# Altium footprint library 常用元件封装库.PcbLib: 1310 footprints (part 9 of 83)
Each footprint in its own frame and in the unit in brackets; x right, y up, seen from the top. Pads: shape width x height; smd on the part's side, far side on the other; paste and mask are expansions set on the pad; w line width, h text height; cw(c..) or ccw(c..) is an arc to the next point about the centre after c.
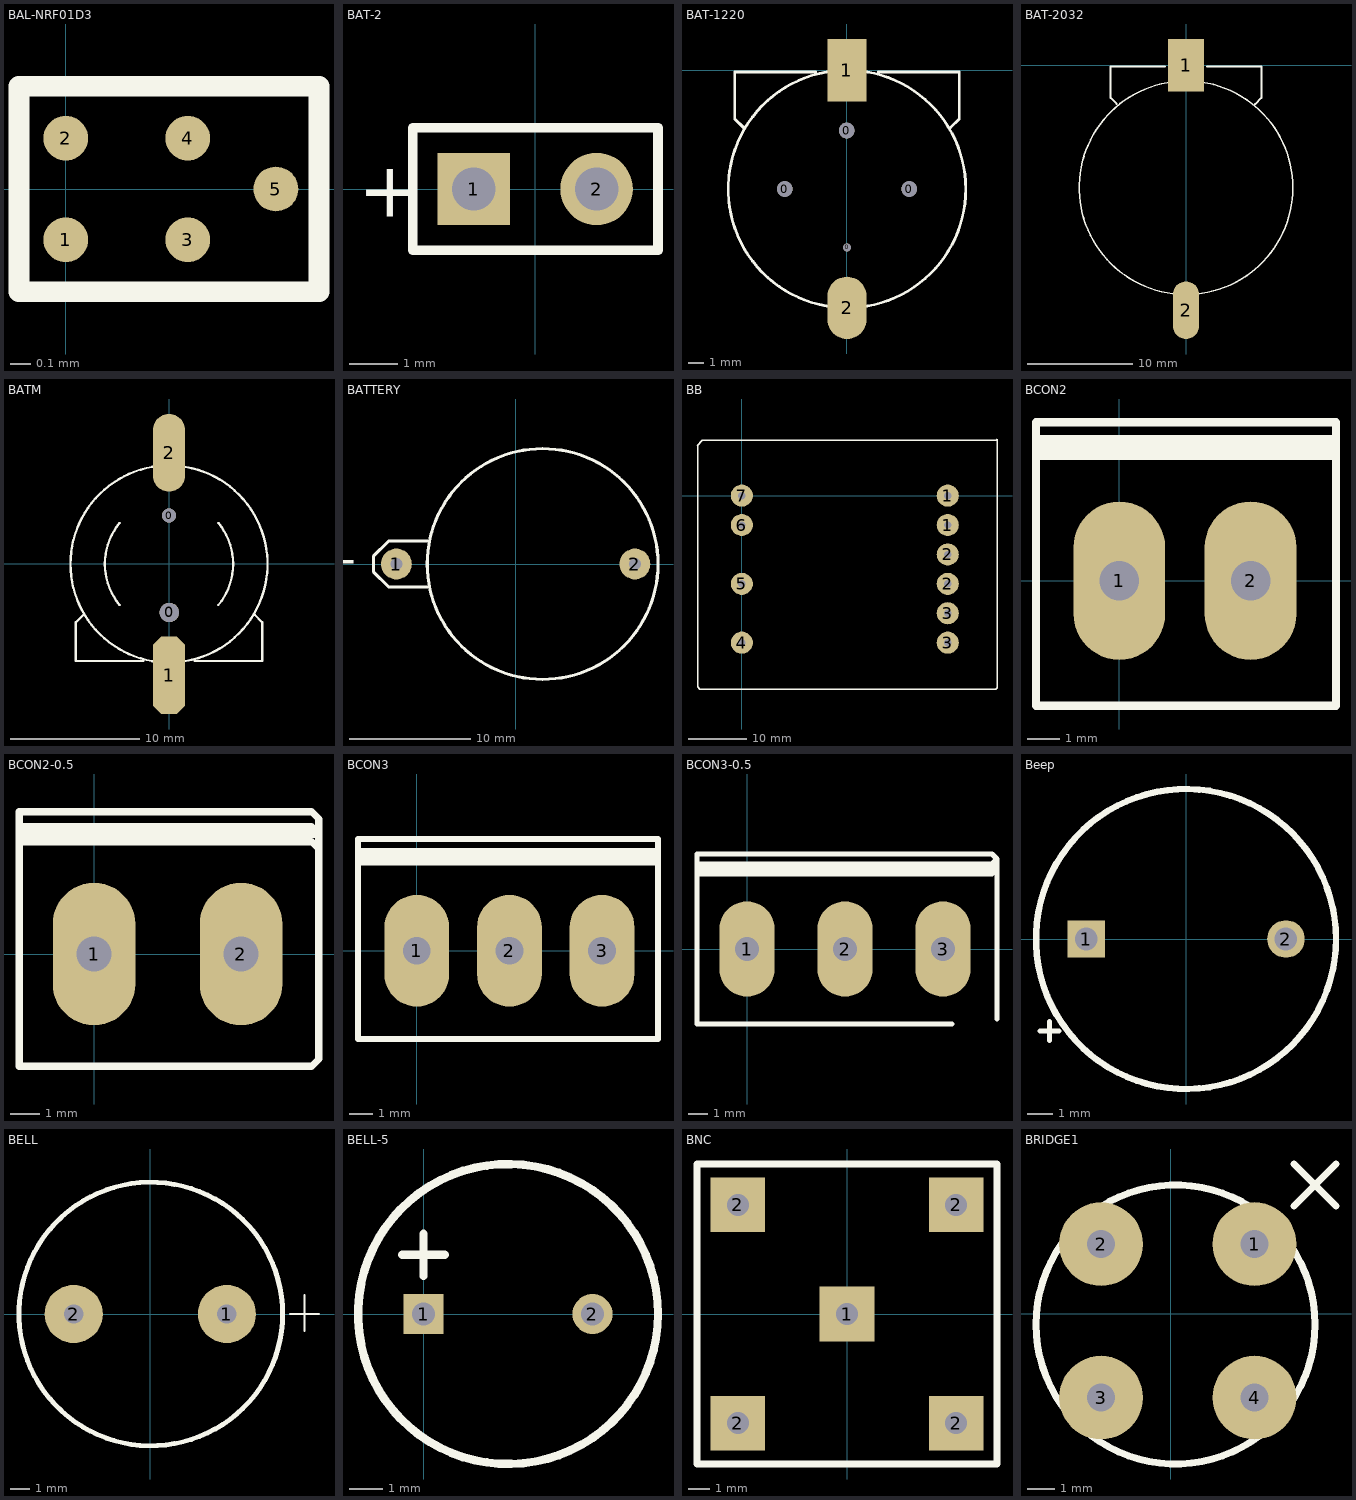
[diagram p8: the footprints below, top view; thin cyan lines are the x and y axes]

## BAL-NRF01D3 [mm]
pads (5):
  round 0.22 smd: 1(0,-0.25) 2(0,0.25) 3(0.6,-0.25) 4(0.6,0.25) 5(1.033,0)
Top Overlay:
  lines w0.102: -0.23,-0.505 1.245,-0.505 1.245,0.505 -0.23,0.505 -0.23,-0.505

## BAT-2 [mm] "Multicell Battery; 2 Leads"
pads (2):
  rect 1.5x1.5 hole 0.9: 1(-1.27,0)
  round 1.5 hole 0.9: 2(1.27,0)
Top Overlay:
  lines w0.2: -2.54,-1.27 2.54,-1.27 2.54,1.27 -2.54,1.27 -2.54,-1.27
  text "+" at -3.67,-0.577 h1.15

## BAT-1220 [mm]
pads (6):
  round 1 hole 1: 0(-3.988,-7.62) 0(-0.025,-3.87) 0(3.988,-7.62)
  round 0.508 hole 0.508: 0(0,-11.37)
  rect 2.5x4 smd: 1(0,0)
  oval 2.5x4 smd: 2(0,-15.24)
Top Overlay:
  lines w0.178: -6.625,-3.695 -7.2,-3.12 -7.2,-0.12 -2,-0.12 ; -0.833,-15.194 cw(c0,-7.62) -0.833,-0.046 ; 0.833,-15.194 ccw(c0,-7.62) 7.62,-7.62 ccw(c0,-7.62) 0.833,-0.046 ; 2,-0.12 7.2,-0.12 7.2,-3.12 6.6,-3.72

## BAT-2032 [mm]
pads (2):
  rect 3.4x5 smd: 1(0,0)
  oval 2.5x5.5 smd: 2(0,-23.4)
Top Overlay:
  circle w0.152: c0,-11.7 r10.2
  lines w0.178: -6.625,-3.695 -7.2,-3.12 -7.2,-0.12 -2,-0.12 ; 2,-0.12 7.2,-0.12 7.2,-3.12 6.6,-3.72

## BATM [mm]
pads (4):
  round 1.1 hole 1.1 unplated: 0(0,3.748)
  round 1.5 hole 1.5 unplated: 0(0.025,-3.752)
  oct 2.5x6 smd: 1(0,-8.602)
  oval 2.5x6 smd: 2(0,8.598)
Top Overlay:
  lines w0.178: -6.6,-3.902 -7.2,-4.502 -7.2,-7.502 -2,-7.502 ; -3.815,-3.171 cw(c0,-0.002) -3.812,3.171 ; -0.833,-7.576 cw(c0,-0.002) -7.62,-0.002 cw(c0,-0.002) -0.833,7.573 ; 0.833,-7.576 ccw(c0,-0.002) 0.833,7.573 ; 2,-7.502 7.2,-7.502 7.2,-4.502 6.625,-3.927 ; 3.81,-3.177 ccw(c0,-0.002) 3.812,3.171
3D body "CR1220.STEP": height 4.03, standoff 2.03, extent -6.2,-5.819 6.2,6.581
3D body "User Library-cr1220.STEP": height 4.05, standoff -0.89, extent -7.504,-8.721 7.493,9.779

## BATTERY [mil]
pads (2):
  round 100 hole 40: 1(-387.5,0) 2(387.5,0)
Top Overlay:
  circle w10: c87.5,0 r375
  lines w10: -287.5,-75 -412.5,-75 -462.5,-25 -462.5,25 -412.5,75 -287.5,75
  text "+" at -512.5,50 h100

## BB [mil]
pads (10):
  round 150 hole 50: 1(1400,-200) 1(1400,0) 2(1400,-600) 2(1400,-400) 3(1400,-1000) 3(1400,-800) 4(0,-1000) 5(0,-600) 6(0,-200) 7(0,0)
Top Overlay:
  lines w10: -305,340 -270,375 1725,375 1735,385 1735,-1305 1725,-1315 -285,-1315 -300,-1300 -300,340

## BCON2 [mil]
pads (2):
  oval 110x190 hole 47.24: 1(0,0) 2(157.48,0)
Top Overlay:
  lines w10: -100,160 260,160 ; -100,170 260,170 ; -100,150 -100,190 260,190 260,150 ; -100,150 260,150 ; -100,150 -100,-150 260,-150 260,150

## BCON2-0.5 [mil]
pads (2):
  oval 110x190 hole 47.24: 1(0,0) 2(196,0)
Top Overlay:
  lines w10: -100,160 260,160 300,160 ; -100,170 260,170 290,170 300,160 ; -100,150 -100,190 260,190 290,190 300,180 ; -100,150 -100,-150 260,-150 290,-150 300,-140 300,160 ; -100,150 260,150 290,150 300,140 ; 300,140 300,180 ; 300,140 300,160 ; 300,160 300,180

## BCON3 [mil]
pads (3):
  oval 110x190 hole 47.24: 1(0,0) 2(157.48,0) 3(314.96,0)
Top Overlay:
  lines w10: -100,160 410,160 ; -100,170 410,170 ; -100,150 -100,-150 400,-150 410,-150 410,150 ; -100,150 410,150 ; -100,150 -100,190 410,190 410,150

## BCON3-0.5 [mil]
pads (3):
  oval 110x190 hole 47.24: 1(0,0) 2(196,0) 3(392,0)
Top Overlay:
  lines w10: -100,160 410,160 500,160 ; -100,170 410,170 490,170 ; 410,-150 400,-150 -100,-150 -100,150 ; 494.46,174.46 500,180 ; 500,-140 500,160 ; -100,150 410,150 490,150 490,170 ; -100,150 -100,190 410,190 490,190 500,180 ; 490,170 500,180 ; 500,160 500,180

## Beep [mm] "蜂鸣器"
height 6
pads (2):
  rect 1.5x1.5 hole 0.9: 1(-4,0)
  round 1.5 hole 0.9: 2(4,0)
Top Overlay:
  circle w0.254: c0,0 r6
  lines w0.2: -5.842,-3.683 -5.08,-3.683 ; -5.461,-4.064 -5.461,-3.302

## BELL [mil]
pads (2):
  round 120 hole 40: 1(158,0) 2(-158,0)
Top Overlay:
  circle w10: c1.11,0 r271.89
  lines w4: 288,0 313,0 ; 302,0 348,0 ; 318,-35 318,39

## BELL-5 [mm]
pads (2):
  rect 1.2x1.2 hole 0.7: 1(0,0)
  round 1.2 hole 0.7: 2(5.08,0)
Top Overlay:
  circle w0.254: c2.54,0 r4.51
  lines w0.254: -0.635,1.778 0.635,1.778 ; 0,1.143 0,2.413
3D body "User Library-PS1240P02BT.STEP": height 6.5, standoff -3, extent -3.564,-6.1 8.636,6.1

## BNC [mil]
pads (5):
  rect 100x100 hole 40: 1(0,0) 2(-200,-200) 2(-200,200) 2(200,-200) 2(200,200)
Top Overlay:
  lines w12: -275,-275 275,-275 275,275 -275,275 -275,-275

## BRIDGE1 [mil]
pads (4):
  round 120 hole 40: 1(120,100) 2(-100,100) 3(-100,-120) 4(120,-120)
Top Overlay:
  circle w10: c6.8,-15.2 r200
  lines w10: 176.8,154.8 236.8,214.8 ; 176.8,214.8 236.8,154.8